# Altium footprint library sun_library.PcbLib: 412 footprints (part 19 of 26)
Each footprint in its own frame and in the unit in brackets; x right, y up, seen from the top. Pads: shape width x height; smd on the part's side, far side on the other; paste and mask are expansions set on the pad; w line width, h text height; cw(c..) or ccw(c..) is an arc to the next point about the centre after c.
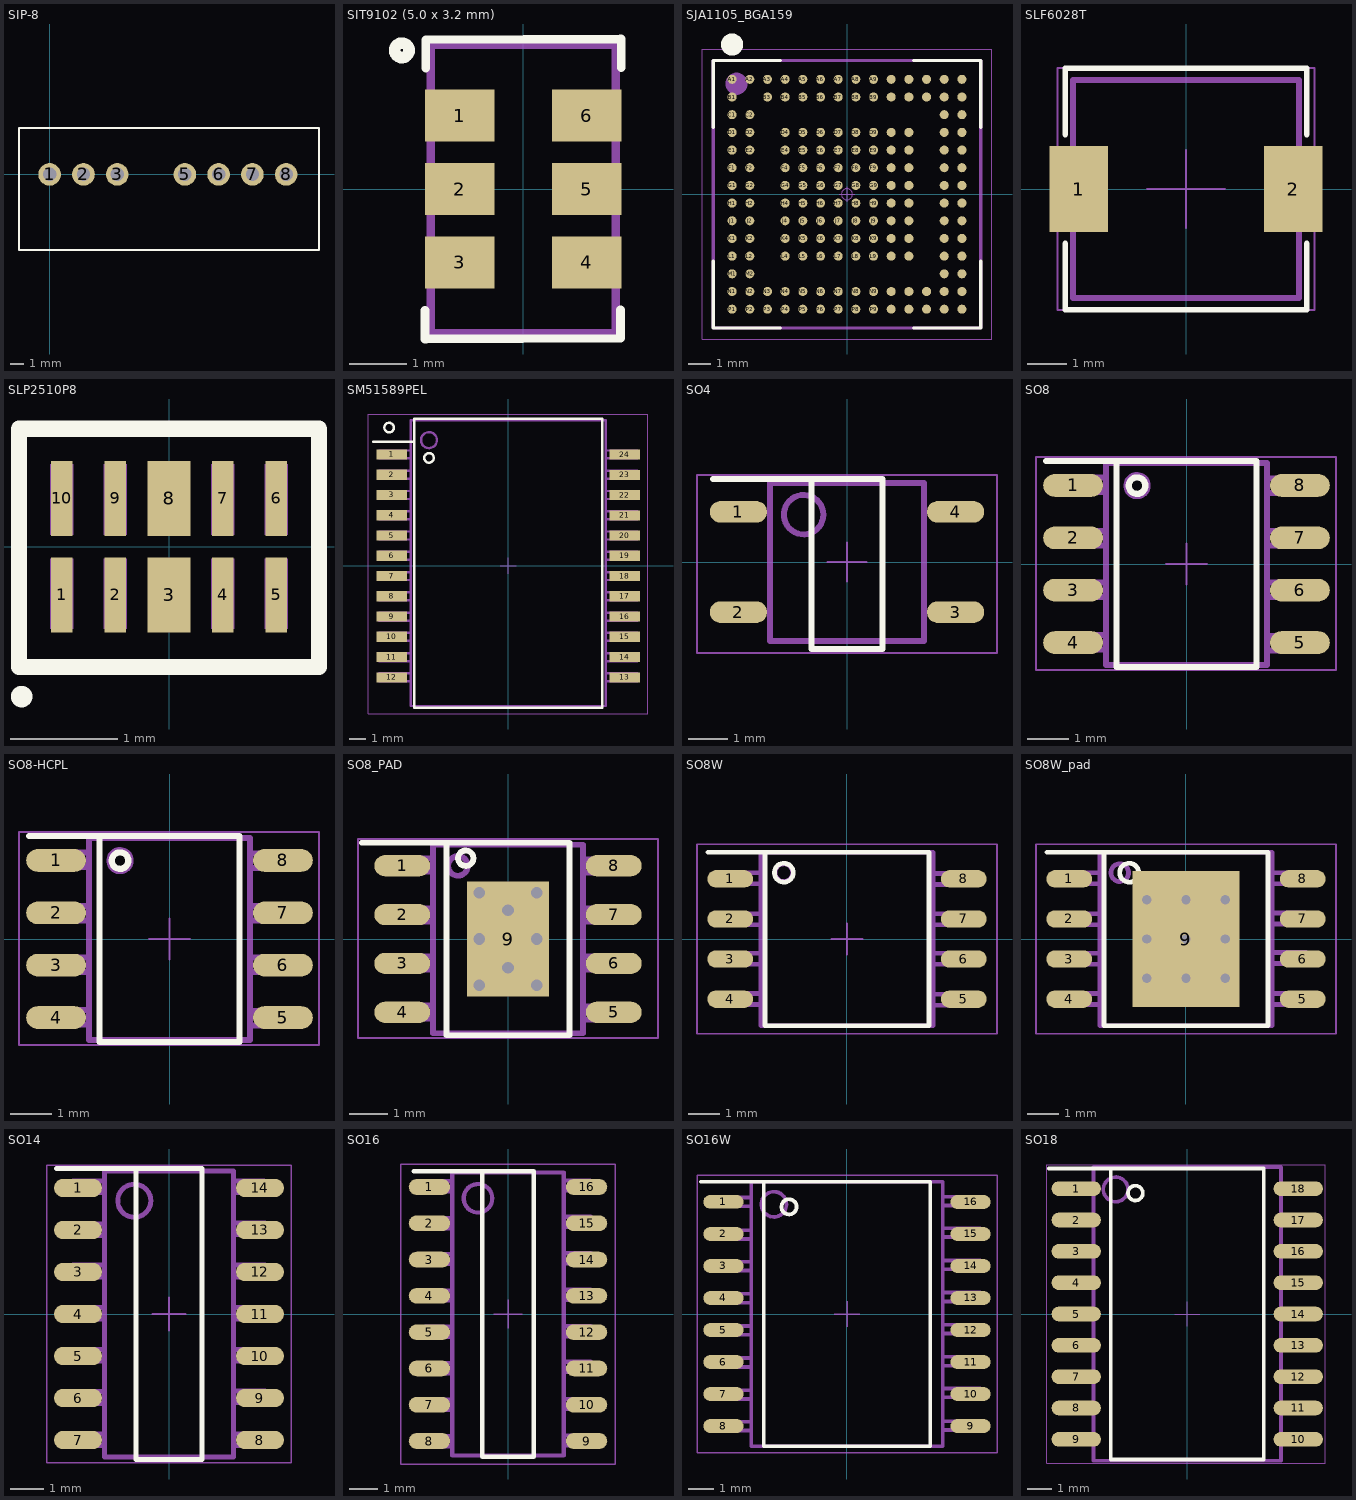
[diagram p18: the footprints below, top view; thin cyan lines are the x and y axes]

## SIP-8 [mm] "DC-DC конвертер"
height 11.1
pads (7):
  round 1.7 hole 1: 1(0,0) 2(2.54,0) 3(5.08,0) 5(10.16,0) 6(12.7,0) 7(15.24,0) 8(17.78,0)
Top Overlay:
  lines w0.15: -2.305,-5.7 20.245,-5.7 20.245,3.5 -2.305,3.5 -2.305,-5.7
3D body "User Library-AM1D-0505S.step": height 10, standoff -3.05, extent -0.75,-4.76 18.75,1.25

## SIT9102 (5.0 x 3.2 mm) [mm] "“3” 5.0 x 3.2 mm  (1-200) MHz High Performance Oscillator"
height 0.75
pads (6):
  rect 1.2x0.9 smd mask+0.1: 1(-1.1,1.27) 2(-1.1,0) 3(-1.1,-1.27) 4(1.1,-1.27) 5(1.1,0) 6(1.1,1.27)
Top Overlay:
  circle w0.2: c-2.1,2.4 r0.125
  lines w0.15: -1.7,-2.1 -1.7,-2.597 -1.678,-2.597 1.685,-2.586 1.685,-2.089 ; -1.685,2.089 -1.685,2.586 1.678,2.597 1.7,2.597 1.7,2.1
TopAssy 13:
  lines w0.15: -1.6,-2.5 1.6,-2.5 1.6,2.5 -1.6,2.5 -1.6,-2.5
3D body "QFN_5032_6pins.stp": height 0.8, standoff -0.05, extent -1.6,-2.5 1.6,2.5

## SJA1105_BGA159 [mm] "Ball Grid Array (BGA), 0.80 mm pitch, square; 196 pin, 12.00 mm L X 12.00 mm W X 0.80 mm H body"
height 0.8
pads (159):
  round 0.41 smd mask+0.05: A1(-5.2,5.2) A2(-4.4,5.2) A3(-3.6,5.2) A4(-2.8,5.2) A5(-2,5.2) A6(-1.2,5.2) A7(-0.4,5.2) A8(0.4,5.2) A9(1.2,5.2) A10(2,5.2) A11(2.8,5.2) A12(3.6,5.2) A13(4.4,5.2) A14(5.2,5.2) B1(-5.2,4.4) B3(-3.6,4.4) B4(-2.8,4.4) B5(-2,4.4) B6(-1.2,4.4) B7(-0.4,4.4) B8(0.4,4.4) B9(1.2,4.4) B10(2,4.4) B11(2.8,4.4) B12(3.6,4.4) B13(4.4,4.4) B14(5.2,4.4) C1(-5.2,3.6) C2(-4.4,3.6) C13(4.4,3.6) C14(5.2,3.6) D1(-5.2,2.8) D2(-4.4,2.8) D4(-2.8,2.8) D5(-2,2.8) D6(-1.2,2.8) D7(-0.4,2.8) D8(0.4,2.8) D9(1.2,2.8) D10(2,2.8) D11(2.8,2.8) D13(4.4,2.8) D14(5.2,2.8) E1(-5.2,2) E2(-4.4,2) E4(-2.8,2) E5(-2,2) E6(-1.2,2) E7(-0.4,2) E8(0.4,2) E9(1.2,2) E10(2,2) E11(2.8,2) E13(4.4,2) E14(5.2,2) F1(-5.2,1.2) F2(-4.4,1.2) F4(-2.8,1.2) F5(-2,1.2) F6(-1.2,1.2) F7(-0.4,1.2) F8(0.4,1.2) F9(1.2,1.2) F10(2,1.2) F11(2.8,1.2) F13(4.4,1.2) F14(5.2,1.2) G1(-5.2,0.4) G2(-4.4,0.4) G4(-2.8,0.4) G5(-2,0.4) G6(-1.2,0.4) G7(-0.4,0.4) G8(0.4,0.4) G9(1.2,0.4) G10(2,0.4) G11(2.8,0.4) G13(4.4,0.4) G14(5.2,0.4) H1(-5.2,-0.4) H2(-4.4,-0.4) H4(-2.8,-0.4) H5(-2,-0.4) H6(-1.2,-0.4) H7(-0.4,-0.4) H8(0.4,-0.4) H9(1.2,-0.4) H10(2,-0.4) H11(2.8,-0.4) H13(4.4,-0.4) H14(5.2,-0.4) J1(-5.2,-1.2) J2(-4.4,-1.2) J4(-2.8,-1.2) J5(-2,-1.2) J6(-1.2,-1.2) J7(-0.4,-1.2) J8(0.4,-1.2) J9(1.2,-1.2) J10(2,-1.2) J11(2.8,-1.2) J13(4.4,-1.2) J14(5.2,-1.2) K1(-5.2,-2) K2(-4.4,-2) K4(-2.8,-2) K5(-2,-2) K6(-1.2,-2) K7(-0.4,-2) K8(0.4,-2) K9(1.2,-2) K10(2,-2) K11(2.8,-2) K13(4.4,-2) K14(5.2,-2) L1(-5.2,-2.8) L2(-4.4,-2.8) L4(-2.8,-2.8) L5(-2,-2.8) L6(-1.2,-2.8) L7(-0.4,-2.8) L8(0.4,-2.8) L9(1.2,-2.8) L10(2,-2.8) L11(2.8,-2.8) L13(4.4,-2.8) L14(5.2,-2.8) M1(-5.2,-3.6) M2(-4.4,-3.6) M13(4.4,-3.6) M14(5.2,-3.6) N1(-5.2,-4.4) N2(-4.4,-4.4) N3(-3.6,-4.4) N4(-2.8,-4.4) N5(-2,-4.4) N6(-1.2,-4.4) N7(-0.4,-4.4) N8(0.4,-4.4) N9(1.2,-4.4) N10(2,-4.4) N11(2.8,-4.4) N12(3.6,-4.4) N13(4.4,-4.4) N14(5.2,-4.4) P1(-5.2,-5.2) P2(-4.4,-5.2) P3(-3.6,-5.2) P4(-2.8,-5.2) P5(-2,-5.2) P6(-1.2,-5.2) P7(-0.4,-5.2) P8(0.4,-5.2) P9(1.2,-5.2) P10(2,-5.2) P11(2.8,-5.2) P12(3.6,-5.2) P13(4.4,-5.2) P14(5.2,-5.2)
Top Overlay:
  circle w0.5: c-5.2,6.775 r0.25
  lines w0.15: -6.05,-3.025 -6.05,-6.05 -3.025,-6.05 ; -6.05,3.025 -6.05,6.05 -3.025,6.05 ; 3.025,-6.05 6.05,-6.05 6.05,-3.025 ; 3.025,6.05 6.05,6.05 6.05,3.025
TopAssy 13:
  circle w0.5: c-5,5 r0.25
  lines w0.15: -6.05,-6.05 6.05,-6.05 6.05,6.05 -6.05,6.05 -6.05,-6.05
CourtTop 15:
  circle w0.05: c0,0 r0.25
  lines w0.05: -0.35,0 0.35,0 ; 0,-0.35 0,0.35 ; -6.55,-6.55 6.55,-6.55 6.55,6.55 -6.55,6.55 -6.55,-6.55
3D body "BGA196CP80_14X14_1200X1200X80B45.STEP": height 0.8, standoff 0, extent -6,-6 6,6

## SLF6028T [mm] "SMT power inductors, SLF6028T series, TDK"
height 2.8
pads (2):
  rect 1.5x2.2 smd: 1(-2.75,0) 2(2.75,0)
Top Overlay:
  lines w0.15: -3.1,-1.4 -3.1,-3.1 3.1,-3.1 3.1,-1.4 ; -3.1,1.4 -3.1,3.1 3.1,3.1 3.1,1.4
TopAssy 13:
  lines w0.15: -3.1,-0.8 -2.7,-0.8 -2.7,0.8 -3.1,0.8 -3.1,-0.8 ; -2.9,-2.8 -2.9,2.8 2.9,2.8 2.9,-2.8 -2.9,-2.8 ; 2.7,-0.8 2.7,0.8 3.1,0.8 3.1,-0.8 2.7,-0.8
CourtTop 15:
  lines w0.05: -1,0 1,0 ; 0,-1 0,1 ; -3.3,-3.1 -3.3,3.1 3.3,3.1 3.3,-3.1 -3.3,-3.1
3D body "Inductor_SLF6028.STEP": height 2.81, standoff 0.01, extent -3,-3 3,3

## SLP2510P8 [mm]
pads (10):
  rect 0.2x0.7 smd mask+0.075: 1(-1,-0.45) 2(-0.5,-0.45) 4(0.5,-0.45) 5(1,-0.45) 6(1,0.45) 7(0.5,0.45) 9(-0.5,0.45) 10(-1,0.45)
  rect 0.4x0.7 smd mask+0.075: 3(0,-0.45) 8(0,0.45)
Top Overlay:
  circle w0.15: c-1.375,-1.4 r0.025
  lines w0.15: -1.4,-1.125 -1.4,1.1 1.4,1.1 1.4,-1.125 -1.4,-1.125
Mechanical 10:
  rectangle: -1.11,-0.77 -0.89,-0.11
  rectangle: -0.61,-0.77 -0.39,-0.11
  rectangle: 0.39,-0.77 0.61,-0.11
  rectangle: 0.89,-0.77 1.11,-0.11
  rectangle: 0.89,0.11 1.11,0.77
  rectangle: 0.39,0.11 0.61,0.77
  rectangle: -0.61,0.11 -0.39,0.77
  rectangle: -1.11,0.11 -0.89,0.77

## SM51589PEL [mm] "Ethernet transformer SM51589PEL Bourns"
height 1.1
pads (24):
  rect 1.9x0.64 smd: 1(-7.3,6.985) 2(-7.3,5.715) 3(-7.3,4.445) 4(-7.3,3.175) 5(-7.3,1.905) 6(-7.3,0.635) 7(-7.3,-0.635) 8(-7.3,-1.905) 9(-7.3,-3.175) 10(-7.3,-4.445) 11(-7.3,-5.715) 12(-7.3,-6.985) 13(7.3,-6.985) 14(7.3,-5.715) 15(7.3,-4.445) 16(7.3,-3.175) 17(7.3,-1.905) 18(7.3,-0.635) 19(7.3,0.635) 20(7.3,1.905) 21(7.3,3.165) 22(7.3,4.435) 23(7.3,5.705) 24(7.3,6.975)
Top Overlay:
  circle w0.15: c-4.965,6.77 r0.3
  circle w0.15: c-7.465,8.67 r0.3
  lines w0.15: -8.465,7.77 -5.965,7.77 ; -5.9,-8.88 5.9,-8.88 5.9,9.22 -5.9,9.22 -5.9,-8.88
TopAssy 13:
  drawing of 197 lines, arcs and shapes, not listed
CourtTop 15:
  lines w0.05: -0.5,0 0.5,0 ; 0,-0.5 0,0.5 ; -8.765,-9.28 8.735,-9.28 8.735,9.52 -8.765,9.52 -8.765,-9.28
3D body "SM51589EL.STP": height 6.01, standoff 0.01, extent -7.875,-8.755 8.075,8.795

## SO4 [mm] "8-Pin Small Outline Integrated Circuit 1.27 mm Pitch, IPC Medium Density"
height 1.73
pads (4):
  oval 1.45x0.55 smd: 1(-2.75,1.27) 2(-2.75,-1.27) 3(2.75,-1.27) 4(2.75,1.27)
Top Overlay:
  lines w0.15: -3.4,2.1 -0.9,2.1 ; -0.9,2.1 0.9,2.1 0.9,-2.2 -0.9,-2.2 -0.9,2.1
TopAssy 13:
  circle w0.15: c-1.1,1.2 r0.5
  lines w0.15: -1.95,-2 -1.95,2 1.95,2 1.95,-2 -1.95,-2
CourtTop 15:
  lines w0.05: -0.5,0 0.5,0 ; 0,-0.5 0,0.5 ; -3.8,-2.3 -3.8,2.2 3.8,2.2 3.8,-2.3 -3.8,-2.3
3D body "User Library-SO4.step": height 2.18, standoff 0, extent -3.04,-2.05 3.04,2.05

## SO8 [mm] "8-Pin Small Outline Integrated Circuit 1.27 mm Pitch, IPC Medium Density"
height 1.73
pads (8):
  oval 1.45x0.55 smd: 1(-2.75,1.905) 2(-2.75,0.635) 3(-2.75,-0.635) 4(-2.75,-1.905) 5(2.75,-1.905) 6(2.75,-0.635) 7(2.75,0.635) 8(2.75,1.905)
Top Overlay:
  circle w0.15: c-1.2,1.9 r0.2
  lines w0.15: -3.4,2.5 -0.9,2.5 ; -1.7,-2.5 1.7,-2.5 1.7,2.5 -1.7,2.5 -1.7,-2.5
TopAssy 13:
  circle w0.15: c-1.2,1.9 r0.255
  lines w0.15: -1.95,-2.075 -2.975,-2.075 -2.975,-1.725 -1.95,-1.725 ; -1.95,-0.8 -3,-0.8 -3,-0.45 -1.95,-0.45 ; -1.95,0.45 -3.025,0.45 -3.025,0.8 -1.95,0.8 ; -1.95,1.75 -3,1.75 -3,2.1 -1.95,2.1 ; 1.95,-2.1 3,-2.1 3,-1.75 1.95,-1.75 ; 1.95,-0.8 3.025,-0.8 3.025,-0.45 1.95,-0.45 ; 1.95,0.45 3,0.45 3,0.8 1.95,0.8 ; 1.95,1.725 2.975,1.725 2.975,2.075 1.95,2.075 ; -1.95,-2.45 -1.95,2.45 1.95,2.45 1.95,-2.45 -1.95,-2.45
CourtTop 15:
  lines w0.05: -0.5,0 0.5,0 ; 0,-0.5 0,0.5 ; -3.65,-2.575 -3.65,2.6 3.625,2.6 3.625,-2.575 -3.65,-2.575
3D body "User Library-SOIC-8.STEP": height 1.75, standoff 0, extent -3.006,-2.5 3.006,2.5

## SO8-HCPL [mm] "OPTOCOULER 8-Pin Small Outline Integrated Circuit 1.27 mm Pitch, IPC Medium Density"
height 3.2
pads (8):
  oval 1.45x0.55 smd: 1(-2.75,1.905) 2(-2.75,0.635) 3(-2.75,-0.635) 4(-2.75,-1.905) 5(2.75,-1.905) 6(2.75,-0.635) 7(2.75,0.635) 8(2.75,1.905)
Top Overlay:
  circle w0.15: c-1.2,1.9 r0.2
  lines w0.15: -3.4,2.5 -0.9,2.5 ; -1.7,-2.5 -1.7,2.5 1.7,2.5 1.7,-2.5 -1.7,-2.5
TopAssy 13:
  circle w0.15: c-1.2,1.9 r0.255
  lines w0.15: -1.95,-2.075 -2.975,-2.075 -2.975,-1.725 -1.95,-1.725 ; -1.95,-0.8 -3,-0.8 -3,-0.45 -1.95,-0.45 ; -1.95,0.45 -3.025,0.45 -3.025,0.8 -1.95,0.8 ; -1.95,1.75 -3,1.75 -3,2.1 -1.95,2.1 ; 1.95,-2.1 3,-2.1 3,-1.75 1.95,-1.75 ; 1.95,-0.8 3.025,-0.8 3.025,-0.45 1.95,-0.45 ; 1.95,0.45 3,0.45 3,0.8 1.95,0.8 ; 1.95,1.725 2.975,1.725 2.975,2.075 1.95,2.075 ; -1.95,-2.45 1.95,-2.45 1.95,2.45 -1.95,2.45 -1.95,-2.45
CourtTop 15:
  lines w0.05: -0.5,0 0.5,0 ; 0,-0.5 0,0.5 ; -3.65,-2.575 3.625,-2.575 3.625,2.6 -3.65,2.6 -3.65,-2.575
3D body "User Library-SO8-HCPL.STEP": height 3.33, standoff -0.4, extent -3.003,-2.5 3.003,2.5

## SO8_PAD [mm] "8-Pin Small Outline Integrated Circuit 1.27 mm Pitch, IPC Medium Density"
height 1.73
pads (9):
  oval 1.45x0.55 smd: 1(-2.75,1.905) 2(-2.75,0.635) 3(-2.75,-0.635) 4(-2.75,-1.905) 5(2.75,-1.905) 6(2.75,-0.635) 7(2.75,0.635) 8(2.75,1.905)
  rect 2.13x3 smd: 9(0,0)
via -0.75,1.2 diameter 0.6 hole 0.3
via 0.75,1.2 diameter 0.6 hole 0.3
via 0.75,0 diameter 0.6 hole 0.3
via 0.75,-1.2 diameter 0.6 hole 0.3
via -0.75,-1.2 diameter 0.6 hole 0.3
via -0.75,0 diameter 0.6 hole 0.3
via 0,-0.75 diameter 0.6 hole 0.3
via 0,0.75 diameter 0.6 hole 0.3
Top Overlay:
  circle w0.15: c-1.1,2.1 r0.2
  lines w0.15: -3.8,2.5 -1.4,2.5 ; -1.6,-2.5 -1.6,2.5 1.6,2.5 1.6,-2.5 -1.6,-2.5
Bottom Solder:
  rectangle: -1.2,-1.7 1.2,1.7
TopAssy 13:
  circle w0.15: c-1.3,1.9 r0.255
  lines w0.15: -1.95,-2.075 -2.975,-2.075 -2.975,-1.725 -1.95,-1.725 ; -1.95,-0.8 -3,-0.8 -3,-0.45 -1.95,-0.45 ; -1.95,0.45 -3.025,0.45 -3.025,0.8 -1.95,0.8 ; -1.95,1.75 -3,1.75 -3,2.1 -1.95,2.1 ; 1.95,-2.1 3,-2.1 3,-1.75 1.95,-1.75 ; 1.95,-0.8 3.025,-0.8 3.025,-0.45 1.95,-0.45 ; 1.95,0.45 3,0.45 3,0.8 1.95,0.8 ; 1.95,1.725 2.975,1.725 2.975,2.075 1.95,2.075 ; -1.95,-2.45 -1.95,2.45 1.95,2.45 1.95,-2.45 -1.95,-2.45
CourtTop 15:
  lines w0.05: -0.5,0 0.5,0 ; 0,-0.5 0,0.5 ; -3.9,-2.575 -3.9,2.6 3.9,2.6 3.9,-2.575 -3.9,-2.575
3D body "User Library-SOIC-8.STEP": height 1.75, standoff 0, extent -3.006,-2.5 3.006,2.5

## SO8W [mm] "SOP, 8-Leads, Body 5.3x5.3mm, Pitch 1.27mm, IPC Medium Density"
height 2.13
pads (8):
  oval 1.45x0.55 smd: 1(-3.7,1.905) 2(-3.7,0.635) 3(-3.7,-0.635) 4(-3.7,-1.905) 5(3.7,-1.905) 6(3.7,-0.635) 7(3.7,0.635) 8(3.7,1.905)
Top Overlay:
  circle w0.15: c-2,2.1 r0.3
  lines w0.15: -4.4,2.75 -1.9,2.75 ; -2.6,-2.75 2.6,-2.75 2.6,2.75 -2.6,2.75 -2.6,-2.75
TopAssy 13:
  circle w0.15: c-2,2.1 r0.28
  lines w0.15: -2.725,-2.075 -3.75,-2.075 -3.75,-1.725 -2.725,-1.725 ; -2.725,-0.8 -3.775,-0.8 -3.775,-0.45 -2.725,-0.45 ; -2.725,0.45 -3.8,0.45 -3.8,0.8 -2.725,0.8 ; -2.725,1.75 -3.775,1.75 -3.775,2.1 -2.725,2.1 ; 2.725,-2.1 3.775,-2.1 3.775,-1.75 2.725,-1.75 ; 2.725,-0.8 3.8,-0.8 3.8,-0.45 2.725,-0.45 ; 2.725,0.45 3.775,0.45 3.775,0.8 2.725,0.8 ; 2.725,1.725 3.75,1.725 3.75,2.075 2.725,2.075 ; -2.725,-2.75 2.725,-2.75 2.725,2.75 -2.725,2.75 -2.725,-2.75
CourtTop 15:
  lines w0.05: -0.5,0 0.5,0 ; 0,-0.5 0,0.5 ; -4.75,-3 4.75,-3 4.75,3 -4.75,3 -4.75,-3
3D body "User Library-SOIC8_Wide_5mmx5mm.step": height 1.75, standoff -0.01, extent -4.102,-2.73 4,2.73

## SO8W_pad [mm] "SOP, 8-Leads, Body 5.3x5.3mm, Pitch 1.27mm, IPC Medium Density"
height 2.13
pads (9):
  oval 1.45x0.55 smd: 1(-3.7,1.905) 2(-3.7,0.635) 3(-3.7,-0.635) 4(-3.7,-1.905) 5(3.7,-1.905) 6(3.7,-0.635) 7(3.7,0.635) 8(3.7,1.905)
  rect 3.4x4.3 smd: 9(0,0)
via 0,0 diameter 0.6 hole 0.3
via 0,1.25 diameter 0.6 hole 0.3
via 0,-1.25 diameter 0.6 hole 0.3
via -1.25,-1.25 diameter 0.6 hole 0.3
via -1.25,0 diameter 0.6 hole 0.3
via -1.25,1.25 diameter 0.6 hole 0.3
via 1.25,1.25 diameter 0.6 hole 0.3
via 1.25,0 diameter 0.6 hole 0.3
via 1.25,-1.25 diameter 0.6 hole 0.3
Top Overlay:
  circle w0.15: c-1.8,2.1 r0.3
  lines w0.15: -4.4,2.75 -1.9,2.75 ; -2.6,-2.75 2.6,-2.75 2.6,2.75 -2.6,2.75 -2.6,-2.75
Bottom Solder:
  rectangle: -1.8,-2.2 1.8,2.3
TopAssy 13:
  circle w0.15: c-2.1,2.1 r0.28
  lines w0.15: -2.725,-2.075 -3.75,-2.075 -3.75,-1.725 -2.725,-1.725 ; -2.725,-0.8 -3.775,-0.8 -3.775,-0.45 -2.725,-0.45 ; -2.725,0.45 -3.8,0.45 -3.8,0.8 -2.725,0.8 ; -2.725,1.75 -3.775,1.75 -3.775,2.1 -2.725,2.1 ; 2.725,-2.075 3.775,-2.075 3.775,-1.725 2.725,-1.725 ; 2.725,-0.775 3.8,-0.775 3.8,-0.425 2.725,-0.425 ; 2.725,0.475 3.775,0.475 3.775,0.825 2.725,0.825 ; 2.725,1.75 3.75,1.75 3.75,2.1 2.725,2.1 ; -2.725,-2.75 2.725,-2.75 2.725,2.75 -2.725,2.75 -2.725,-2.75
CourtTop 15:
  lines w0.05: -0.5,0 0.5,0 ; 0,-0.5 0,0.5 ; -4.75,-3 4.75,-3 4.75,3 -4.75,3 -4.75,-3
3D body "User Library-SOIC8_Wide_5mmx5mm.step": height 1.75, standoff -0.01, extent -4.052,-2.73 4.05,2.73

## SO14 [mm] "SOIC, 14-Leads, Body 8.7x3.9mm, Pitch 1.27mm, IPC High Density"
height 1.75
pads (14):
  oval 1.45x0.55 smd: 1(-2.75,3.81) 2(-2.75,2.54) 3(-2.75,1.27) 4(-2.75,0) 5(-2.75,-1.27) 6(-2.75,-2.54) 7(-2.75,-3.81) 8(2.75,-3.81) 9(2.75,-2.54) 10(2.75,-1.27) 11(2.75,0) 12(2.75,1.27) 13(2.75,2.54) 14(2.75,3.81)
Top Overlay:
  lines w0.15: -3.4,4.4 -1,4.4 ; -1,4.4 1,4.4 1,-4.4 -1,-4.4 -1,4.4
TopAssy 13:
  circle w0.15: c-1.05,3.425 r0.5
  lines w0.15: -1.95,-3.975 -2.875,-3.975 -2.875,-3.625 -1.95,-3.625 ; -1.95,-2.7 -2.9,-2.7 -2.9,-2.35 -1.95,-2.35 ; -1.95,-1.425 -2.9,-1.425 -2.9,-1.075 -1.95,-1.075 ; -1.95,-0.15 -2.9,-0.15 -2.9,0.2 -1.95,0.2 ; -1.95,1.125 -2.9,1.125 -2.9,1.475 -1.95,1.475 ; -1.95,2.375 -2.9,2.375 -2.9,2.725 -1.95,2.725 ; -1.95,3.675 -2.9,3.675 -2.9,4.025 -1.95,4.025 ; 1.95,-3.975 2.9,-3.975 2.9,-3.625 1.95,-3.625 ; 1.95,-2.675 2.9,-2.675 2.9,-2.325 1.95,-2.325 ; 1.95,-1.425 2.9,-1.425 2.9,-1.075 1.95,-1.075 ; 1.95,-0.15 2.9,-0.15 2.9,0.2 1.95,0.2 ; 1.95,1.125 2.9,1.125 2.9,1.475 1.95,1.475 ; 1.95,2.4 2.9,2.4 2.9,2.75 1.95,2.75 ; 1.95,3.675 2.875,3.675 2.875,4.025 1.95,4.025 ; -1.95,-4.325 1.95,-4.325 1.95,4.325 -1.95,4.325 -1.95,-4.325
CourtTop 15:
  lines w0.05: -0.5,0 0.5,0 ; 0,-0.5 0,0.5 ; -3.7,-4.5 3.7,-4.5 3.7,4.5 -3.7,4.5 -3.7,-4.5
3D body "User Library-so14-1.STEP": height 1.7, standoff 0, extent -3,-4.4 3,4.4

## SO16 [mm] "SOIC, 16-Leads, Body 9.9x3.9mm, Pitch 1.27mm, IPC Medium Density"
height 1.75
pads (16):
  oval 1.45x0.55 smd: 1(-2.75,4.445) 2(-2.75,3.175) 3(-2.75,1.905) 4(-2.75,0.635) 5(-2.75,-0.635) 6(-2.75,-1.905) 7(-2.75,-3.175) 8(-2.75,-4.445) 9(2.75,-4.445) 10(2.75,-3.175) 11(2.75,-1.905) 12(2.75,-0.635) 13(2.75,0.635) 14(2.75,1.905) 15(2.75,3.175) 16(2.75,4.445)
Top Overlay:
  lines w0.15: -3.3,5 -0.9,5 ; -0.9,5 -0.9,-5 0.9,-5 0.9,5 -0.9,5
TopAssy 13:
  circle w0.15: c-1.05,4.05 r0.5
  lines w0.15: -1.95,-4.625 -2.875,-4.625 -2.875,-4.275 -1.95,-4.275 ; -1.95,-3.35 -2.875,-3.35 -2.875,-3 -1.95,-3 ; -1.95,-2.075 -2.9,-2.075 -2.9,-1.725 -1.95,-1.725 ; -1.95,-0.8 -2.9,-0.8 -2.9,-0.45 -1.95,-0.45 ; -1.95,0.475 -2.9,0.475 -2.9,0.825 -1.95,0.825 ; -1.95,1.75 -2.9,1.75 -2.9,2.1 -1.95,2.1 ; -1.95,3 -2.9,3 -2.9,3.35 -1.95,3.35 ; -1.95,4.3 -2.9,4.3 -2.9,4.65 -1.95,4.65 ; 1.95,-4.6 2.9,-4.6 2.9,-4.25 1.95,-4.25 ; 1.95,-3.325 2.9,-3.325 2.9,-2.975 1.95,-2.975 ; 1.95,-2.025 2.9,-2.025 2.9,-1.675 1.95,-1.675 ; 1.95,-0.775 2.9,-0.775 2.9,-0.425 1.95,-0.425 ; 1.95,0.5 2.9,0.5 2.9,0.85 1.95,0.85 ; 1.95,1.775 2.9,1.775 2.9,2.125 1.95,2.125 ; 1.95,3.05 2.9,3.05 2.9,3.4 1.95,3.4 ; 1.95,4.325 2.875,4.325 2.875,4.675 1.95,4.675 ; -1.95,-4.95 -1.95,4.95 1.95,4.95 1.95,-4.95 -1.95,-4.95
CourtTop 15:
  lines w0.05: -0.5,0 0.5,0 ; 0,-0.5 0,0.5 ; -3.75,-5.25 -3.75,5.25 3.75,5.25 3.75,-5.25 -3.75,-5.25
3D body "User Library-so16-1.step": height 1.75, standoff -0.02, extent -3.068,-4.985 3.068,4.985

## SO16W [mm] "SOIC, 16-Leads, Body 10.3x7.5mm, Pitch 1.27mm, IPC Medium Density"
height 2.67
pads (16):
  oval 1.6x0.55 smd: 1(-4.9,4.45) 2(-4.9,3.175) 3(-4.9,1.905) 4(-4.9,0.635) 5(-4.9,-0.635) 6(-4.9,-1.905) 7(-4.9,-3.175) 8(-4.9,-4.445) 9(4.9,-4.445) 10(4.9,-3.175) 11(4.9,-1.905) 12(4.9,-0.635) 13(4.9,0.635) 14(4.9,1.905) 15(4.9,3.175) 16(4.9,4.445)
Top Overlay:
  circle w0.15: c-2.3,4.25 r0.3
  lines w0.15: -5.8,5.25 -3.3,5.25 ; -3.3,5.25 -3.3,-5.25 3.3,-5.25 3.3,5.25 -3.3,5.25
TopAssy 13:
  circle w0.15: c-2.9,4.35 r0.5
  lines w0.15: -3.8,-4.625 -5.275,-4.625 -5.275,-4.275 -3.8,-4.275 ; -3.8,-3.375 -5.275,-3.375 -5.275,-3.025 -3.8,-3.025 ; -3.8,-2.1 -5.275,-2.1 -5.275,-1.75 -3.8,-1.75 ; -3.8,-0.825 -5.275,-0.825 -5.275,-0.475 -3.8,-0.475 ; -3.8,0.45 -5.275,0.45 -5.275,0.8 -3.8,0.8 ; -3.8,1.725 -5.275,1.725 -5.275,2.075 -3.8,2.075 ; -3.8,2.975 -5.275,2.975 -5.275,3.325 -3.8,3.325 ; -3.8,4.275 -5.275,4.275 -5.275,4.625 -3.8,4.625 ; 3.8,-4.6 5.275,-4.6 5.275,-4.25 3.8,-4.25 ; 3.8,-3.3 5.275,-3.3 5.275,-2.95 3.8,-2.95 ; 3.8,-2.05 5.275,-2.05 5.275,-1.7 3.8,-1.7 ; 3.8,-0.775 5.275,-0.775 5.275,-0.425 3.8,-0.425 ; 3.8,0.5 5.275,0.5 5.275,0.85 3.8,0.85 ; 3.8,1.775 5.275,1.775 5.275,2.125 3.8,2.125 ; 3.8,3.05 5.275,3.05 5.275,3.4 3.8,3.4 ; 3.8,4.3 5.275,4.3 5.275,4.65 3.8,4.65 ; -3.8,-5.25 -3.8,5.25 3.8,5.25 3.8,-5.25 -3.8,-5.25
CourtTop 15:
  lines w0.05: -0.5,0 0.5,0 ; 0,-0.5 0,0.5 ; -5.95,-5.5 -5.95,5.5 5.95,5.5 5.95,-5.5 -5.95,-5.5
3D body "User Library-SOIC-16-300.STEP": height 2.57, standoff -0.03, extent -5.3,-5.25 5.3,5.25

## SO18 [mm] "SOIC, 18-Leads, Body 11.5x7.5mm, Pitch 1.27mm, IPC High Density"
height 2.65
pads (18):
  oval 2x0.6 smd: 1(-4.5,5.08) 2(-4.5,3.81) 3(-4.5,2.54) 4(-4.5,1.27) 5(-4.5,0) 6(-4.5,-1.27) 7(-4.5,-2.54) 8(-4.5,-3.81) 9(-4.5,-5.08) 10(4.5,-5.08) 11(4.5,-3.81) 12(4.5,-2.54) 13(4.5,-1.27) 14(4.5,0) 15(4.5,1.27) 16(4.5,2.54) 17(4.5,3.81) 18(4.5,5.08)
Top Overlay:
  circle w0.15: c-2.1,4.9 r0.3
  lines w0.15: -5.6,5.9 -3.1,5.9 ; -3.1,5.9 -3.1,-5.9 3.1,-5.9 3.1,5.9 -3.1,5.9
TopAssy 13:
  circle w0.15: c-2.9,5.05 r0.5
  lines w0.15: -3.8,-5.25 -5.275,-5.25 -5.275,-4.9 -3.8,-4.9 ; -3.8,-3.975 -5.275,-3.975 -5.275,-3.625 -3.8,-3.625 ; -3.8,-2.725 -5.275,-2.725 -5.275,-2.375 -3.8,-2.375 ; -3.8,-1.45 -5.275,-1.45 -5.275,-1.1 -3.8,-1.1 ; -3.8,-0.175 -5.275,-0.175 -5.275,0.175 -3.8,0.175 ; -3.8,1.1 -5.275,1.1 -5.275,1.45 -3.8,1.45 ; -3.8,2.375 -5.275,2.375 -5.275,2.725 -3.8,2.725 ; -3.8,3.625 -5.275,3.625 -5.275,3.975 -3.8,3.975 ; -3.8,4.925 -5.275,4.925 -5.275,5.275 -3.8,5.275 ; 3.8,-5.25 5.275,-5.25 5.275,-4.9 3.8,-4.9 ; 3.8,-3.95 5.275,-3.95 5.275,-3.6 3.8,-3.6 ; 3.8,-2.7 5.275,-2.7 5.275,-2.35 3.8,-2.35 ; 3.8,-1.425 5.275,-1.425 5.275,-1.075 3.8,-1.075 ; 3.8,-0.15 5.275,-0.15 5.275,0.2 3.8,0.2 ; 3.8,1.125 5.275,1.125 5.275,1.475 3.8,1.475 ; 3.8,2.4 5.275,2.4 5.275,2.75 3.8,2.75 ; 3.8,3.65 5.275,3.65 5.275,4 3.8,4 ; 3.8,4.925 5.275,4.925 5.275,5.275 3.8,5.275 ; -3.8,-5.95 -3.8,5.95 3.8,5.95 3.8,-5.95 -3.8,-5.95
CourtTop 15:
  lines w0.05: -0.5,0 0.5,0 ; 0,-0.5 0,0.5 ; -5.7,-6.05 -5.7,6.05 5.6,6.05 5.6,-6.05 -5.7,-6.05
3D body "User Library-SOIC-18-300.STEP": height 2.57, standoff -0.03, extent -5.3,-5.875 5.3,5.875